# Altium footprint library Nixie_PcbLib.PcbLib: 1 footprints
Each footprint in its own frame and in the unit in brackets; x right, y up, seen from the top. Pads: shape width x height; smd on the part's side, far side on the other; paste and mask are expansions set on the pad; w line width, h text height; cw(c..) or ccw(c..) is an arc to the next point about the centre after c.
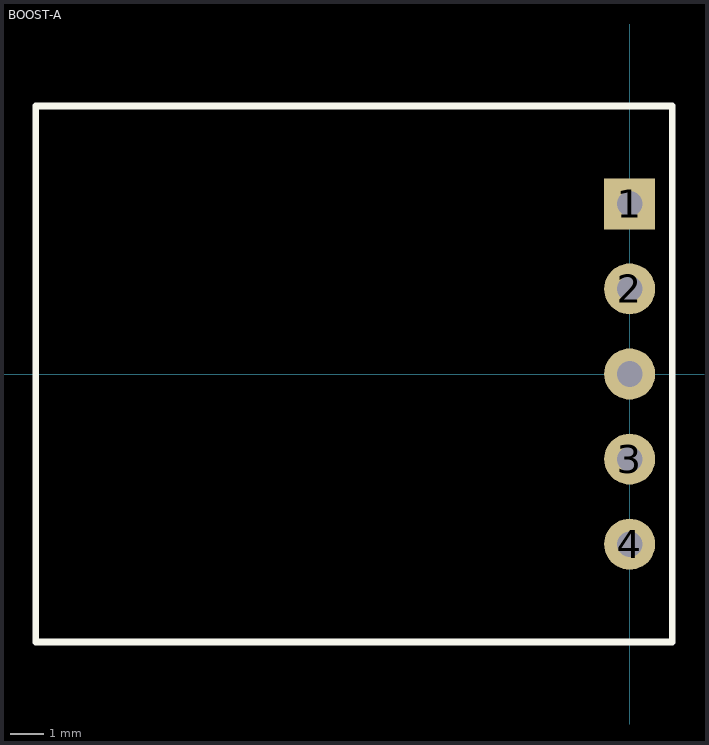
[diagram p0: the footprint, top view; thin cyan lines are the x and y axes]

## BOOST-A [mil] "5V-170V升压模块"
pads (5):
  rect 60x60 hole 30: 1(0,200)
  round 60 hole 30: 2(0,100) 3(0,-100) 4(0,-200) ""(0,0)
Top Overlay:
  lines w7.87: -698.03,-314.96 -698.03,314.96 50,314.96 50,-314.96 -698.03,-314.96
3D body "排针.STEP": height 334.65, standoff -137.8, extent -49.99,149.99 50.01,249.99
3D body "排针.STEP": height 334.65, standoff -137.8, extent -49.99,49.99 50.01,149.99
3D body "排针.STEP": height 334.65, standoff -137.8, extent -49.99,-50.01 50.01,49.99
3D body "排针.STEP": height 334.65, standoff -137.8, extent -49.99,-150.01 50.01,-50.01
3D body "排针.STEP": height 334.65, standoff -137.8, extent -49.99,-250.01 50.01,-150.01